# Altium footprint library WR-DSUB_Male.PcbLib: 32 footprints (part 1 of 2)
Each footprint in its own frame and in the unit in brackets; x right, y up, seen from the top. Pads: shape width x height; smd on the part's side, far side on the other; paste and mask are expansions set on the pad; w line width, h text height; cw(c..) or ccw(c..) is an arc to the next point about the centre after c.
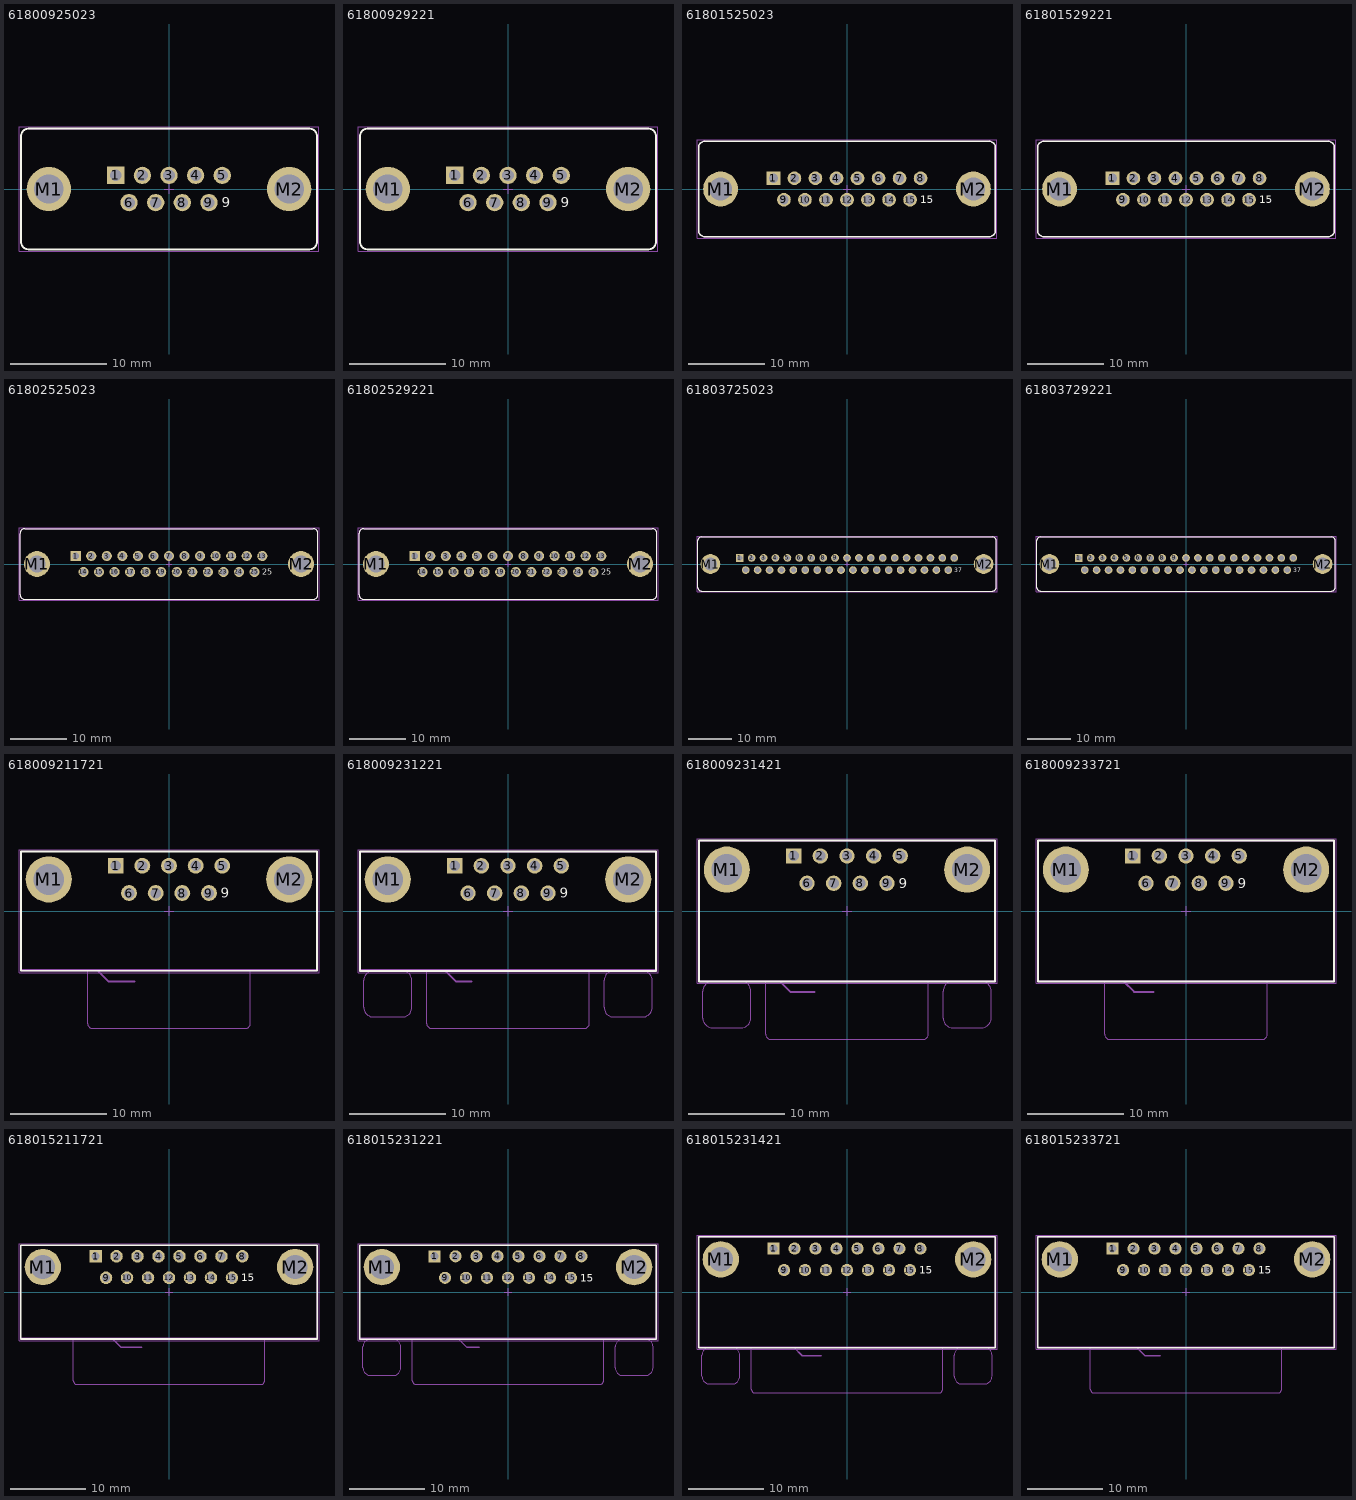
[diagram p0: the footprints below, top view; thin cyan lines are the x and y axes]

## 61800925023 [mm] "9 pins, straight"
height 10.9
pads (11):
  rect 1.8x1.8 hole 1.2: 1(-5.54,1.42)
  round 1.8 hole 1.2: 2(-2.77,1.42) 3(0,1.42) 4(2.77,1.42) 5(5.54,1.42) 6(-4.155,-1.42) 7(-1.385,-1.42) 8(1.385,-1.42) 9(4.155,-1.42)
  round 4.6 hole 3.05: M1(-12.5,0) M2(12.5,0)
Top Overlay:
  lines w0.2: -15.405,-5.475 ccw(c-14.605,-5.475) -14.605,-6.275 14.605,-6.275 ccw(c14.605,-5.475) 15.405,-5.475 15.405,5.475 ccw(c14.605,5.475) 14.605,6.275 -14.605,6.275 ccw(c-14.605,5.475) -15.405,5.475 -15.405,-5.475
  text "9" at 5.5,-1.9 h1.02
Mechanical 13:
  lines w0.1: -15.405,-5.475 ccw(c-14.605,-5.475) -14.605,-6.275 14.605,-6.275 ccw(c14.605,-5.475) 15.405,-5.475 15.405,5.475 ccw(c14.605,5.475) 14.605,6.275 -14.605,6.275 ccw(c-14.605,5.475) -15.405,5.475 -15.405,-5.475
Mechanical 15:
  lines w0.05: -0.5,0 0.5,0 ; 0,-0.5 0,0.5 ; -15.605,-6.475 -15.605,6.475 15.605,6.475 15.605,-6.475 -15.605,-6.475
3D body "61800925023.stp": height 13.22, standoff -3.83, extent -15.4,-6.275 15.4,6.275

## 61800929221 [mm] "Male 09p Straight With board clip & Hex screw UNC 4-40"
height 10.9
pads (11):
  rect 1.8x1.8 hole 1.2: 1(-5.54,1.42)
  round 1.8 hole 1.2: 2(-2.77,1.42) 3(0,1.42) 4(2.77,1.42) 5(5.54,1.42) 6(-4.155,-1.42) 7(-1.385,-1.42) 8(1.385,-1.42) 9(4.155,-1.42)
  round 4.6 hole 3.05: M1(-12.5,0) M2(12.5,0)
Top Overlay:
  lines w0.2: -15.405,-5.475 ccw(c-14.605,-5.475) -14.605,-6.275 14.605,-6.275 ccw(c14.605,-5.475) 15.405,-5.475 15.405,5.475 ccw(c14.605,5.475) 14.605,6.275 -14.605,6.275 ccw(c-14.605,5.475) -15.405,5.475 -15.405,-5.475
  text "9" at 5.5,-1.9 h1.02
Mechanical 13:
  lines w0.1: -15.405,-5.475 ccw(c-14.605,-5.475) -14.605,-6.275 14.605,-6.275 ccw(c14.605,-5.475) 15.405,-5.475 15.405,5.475 ccw(c14.605,5.475) 14.605,6.275 -14.605,6.275 ccw(c-14.605,5.475) -15.405,5.475 -15.405,-5.475
Mechanical 15:
  lines w0.05: -0.5,0 0.5,0 ; 0,-0.5 0,0.5 ; -15.605,-6.475 -15.605,6.475 15.605,6.475 15.605,-6.475 -15.605,-6.475
3D body "61800929221.stp": height 13.22, standoff -3.88, extent -15.4,-6.275 15.4,6.275

## 61801525023 [mm] "15 pins, straight"
height 10.9
pads (17):
  rect 1.8x1.8 hole 1.2: 1(-9.695,1.42)
  round 1.8 hole 1.2: 2(-6.925,1.42) 3(-4.155,1.42) 4(-1.385,1.42) 5(1.385,1.42) 6(4.155,1.42) 7(6.925,1.42) 8(9.695,1.42) 9(-8.31,-1.42) 10(-5.54,-1.42) 11(-2.77,-1.42) 12(0,-1.42) 13(2.77,-1.42) 14(5.54,-1.42) 15(8.31,-1.42)
  round 4.6 hole 3.05: M1(-16.66,0) M2(16.66,0)
Top Overlay:
  lines w0.2: -19.57,-5.475 ccw(c-18.77,-5.475) -18.77,-6.275 18.77,-6.275 ccw(c18.77,-5.475) 19.57,-5.475 19.57,5.475 ccw(c18.77,5.475) 18.77,6.275 -18.77,6.275 ccw(c-18.77,5.475) -19.57,5.475 -19.57,-5.475
  text "15" at 9.655,-1.9 h1.02
Mechanical 13:
  lines w0.1: -19.57,-5.475 ccw(c-18.77,-5.475) -18.77,-6.275 18.77,-6.275 ccw(c18.77,-5.475) 19.57,-5.475 19.57,5.475 ccw(c18.77,5.475) 18.77,6.275 -18.77,6.275 ccw(c-18.77,5.475) -19.57,5.475 -19.57,-5.475
Mechanical 15:
  lines w0.05: -0.5,0 0.5,0 ; 0,-0.5 0,0.5 ; -19.77,-6.475 -19.77,6.475 19.77,6.475 19.77,-6.475 -19.77,-6.475
3D body "61801525023.stp": height 13.22, standoff -3.83, extent -19.6,-6.275 19.6,6.275

## 61801529221 [mm] "Male 15p Straight With board clip & Hex screw UNC 4-40"
height 10.9
pads (17):
  rect 1.8x1.8 hole 1.2: 1(-9.695,1.42)
  round 1.8 hole 1.2: 2(-6.925,1.42) 3(-4.155,1.42) 4(-1.385,1.42) 5(1.385,1.42) 6(4.155,1.42) 7(6.925,1.42) 8(9.695,1.42) 9(-8.31,-1.42) 10(-5.54,-1.42) 11(-2.77,-1.42) 12(0,-1.42) 13(2.77,-1.42) 14(5.54,-1.42) 15(8.31,-1.42)
  round 4.6 hole 3.05: M1(-16.66,0) M2(16.66,0)
Top Overlay:
  lines w0.2: -19.57,-5.475 ccw(c-18.77,-5.475) -18.77,-6.275 18.77,-6.275 ccw(c18.77,-5.475) 19.57,-5.475 19.57,5.475 ccw(c18.77,5.475) 18.77,6.275 -18.77,6.275 ccw(c-18.77,5.475) -19.57,5.475 -19.57,-5.475
  text "15" at 9.655,-1.9 h1.02
Mechanical 13:
  lines w0.1: -19.57,-5.475 ccw(c-18.77,-5.475) -18.77,-6.275 18.77,-6.275 ccw(c18.77,-5.475) 19.57,-5.475 19.57,5.475 ccw(c18.77,5.475) 18.77,6.275 -18.77,6.275 ccw(c-18.77,5.475) -19.57,5.475 -19.57,-5.475
Mechanical 15:
  lines w0.05: -0.5,0 0.5,0 ; 0,-0.5 0,0.5 ; -19.77,-6.475 -19.77,6.475 19.77,6.475 19.77,-6.475 -19.77,-6.475
3D body "61801529221.stp": height 13.22, standoff -3.88, extent -19.6,-6.275 19.6,6.275

## 61802525023 [mm] "25 pins, straight"
height 10.9
pads (27):
  rect 1.8x1.8 hole 1.2: 1(-16.62,1.42)
  round 1.8 hole 1.2: 2(-13.85,1.42) 3(-11.08,1.42) 4(-8.31,1.42) 5(-5.54,1.42) 6(-2.77,1.42) 7(0,1.42) 8(2.77,1.42) 9(5.54,1.42) 10(8.31,1.42) 11(11.08,1.42) 12(13.85,1.42) 13(16.62,1.42) 14(-15.235,-1.42) 15(-12.465,-1.42) 16(-9.695,-1.42) 17(-6.925,-1.42) 18(-4.155,-1.42) 19(-1.385,-1.42) 20(1.385,-1.42) 21(4.155,-1.42) 22(6.925,-1.42) 23(9.695,-1.42) 24(12.465,-1.42) 25(15.235,-1.42)
  round 4.6 hole 3.05: M1(-23.52,0) M2(23.52,0)
Top Overlay:
  lines w0.2: -26.52,5.425 -26.52,-5.475 ccw(c-25.72,-5.475) -25.72,-6.275 25.72,-6.275 ccw(c25.72,-5.475) 26.52,-5.475 26.52,5.425 ; -26.52,5.475 cw(c-25.72,5.475) -25.72,6.275 25.72,6.275 cw(c25.72,5.475) 26.52,5.475
  text "25" at 16.58,-1.9 h1.02
Mechanical 13:
  lines w0.1: -26.52,5.425 -26.52,-5.475 ccw(c-25.72,-5.475) -25.72,-6.275 25.72,-6.275 ccw(c25.72,-5.475) 26.52,-5.475 26.52,5.425 ; -26.52,5.475 cw(c-25.72,5.475) -25.72,6.275 25.72,6.275 cw(c25.72,5.475) 26.52,5.475
Mechanical 15:
  lines w0.05: -0.5,0 0.5,0 ; 0,-0.5 0,0.5 ; -26.72,-6.475 26.72,-6.475 26.72,6.475 -26.72,6.475 -26.72,-6.475
3D body "61802525023.stp": height 13.22, standoff -3.83, extent -26.525,-6.275 26.525,6.275

## 61802529221 [mm] "Male 25p Straight With board clip & Hex screw UNC 4-40"
height 10.9
pads (27):
  rect 1.8x1.8 hole 1.2: 1(-16.62,1.42)
  round 1.8 hole 1.2: 2(-13.85,1.42) 3(-11.08,1.42) 4(-8.31,1.42) 5(-5.54,1.42) 6(-2.77,1.42) 7(0,1.42) 8(2.77,1.42) 9(5.54,1.42) 10(8.31,1.42) 11(11.08,1.42) 12(13.85,1.42) 13(16.62,1.42) 14(-15.235,-1.42) 15(-12.465,-1.42) 16(-9.695,-1.42) 17(-6.925,-1.42) 18(-4.155,-1.42) 19(-1.385,-1.42) 20(1.385,-1.42) 21(4.155,-1.42) 22(6.925,-1.42) 23(9.695,-1.42) 24(12.465,-1.42) 25(15.235,-1.42)
  round 4.6 hole 3.05: M1(-23.52,0) M2(23.52,0)
Top Overlay:
  lines w0.2: -26.52,-5.475 ccw(c-25.72,-5.475) -25.72,-6.275 25.72,-6.275 ccw(c25.72,-5.475) 26.52,-5.475 26.52,5.475 ccw(c25.72,5.475) 25.72,6.275 -25.72,6.275 ccw(c-25.72,5.475) -26.52,5.475 -26.52,-5.475
  text "25" at 16.58,-1.9 h1.02
Mechanical 13:
  lines w0.1: -26.52,-5.475 ccw(c-25.72,-5.475) -25.72,-6.275 25.72,-6.275 ccw(c25.72,-5.475) 26.52,-5.475 26.52,5.475 ccw(c25.72,5.475) 25.72,6.275 -25.72,6.275 ccw(c-25.72,5.475) -26.52,5.475 -26.52,-5.475
Mechanical 15:
  lines w0.05: -0.5,0 0.5,0 ; 0,-0.5 0,0.5 ; -26.72,-6.475 26.72,-6.475 26.72,6.475 -26.72,6.475 -26.72,-6.475
3D body "61802529221.stp": height 13.22, standoff -3.88, extent -26.525,-6.275 26.525,6.275

## 61803725023 [mm] "37 pins, straight"
height 10.9
pads (39):
  rect 1.8x1.8 hole 1.2: 1(-24.93,1.42)
  round 1.8 hole 1.2: 2(-22.16,1.42) 3(-19.39,1.42) 4(-16.62,1.42) 5(-13.85,1.42) 6(-11.08,1.42) 7(-8.31,1.42) 8(-5.54,1.42) 9(-2.77,1.42) 10(0,1.42) 11(2.77,1.42) 12(5.54,1.42) 13(8.31,1.42) 14(11.08,1.42) 15(13.85,1.42) 16(16.62,1.42) 17(19.39,1.42) 18(22.16,1.42) 19(24.93,1.42) 20(-23.545,-1.42) 21(-20.775,-1.42) 22(-18.005,-1.42) 23(-15.235,-1.42) 24(-12.465,-1.42) 25(-9.695,-1.42) 26(-6.925,-1.42) 27(-4.155,-1.42) 28(-1.385,-1.42) 29(1.385,-1.42) 30(4.155,-1.42) 31(6.925,-1.42) 32(9.695,-1.42) 33(12.465,-1.42) 34(15.235,-1.42) 35(18.005,-1.42) 36(20.775,-1.42) 37(23.545,-1.42)
  round 4.6 hole 3.05: M1(-31.75,0) M2(31.75,0)
Top Overlay:
  lines w0.2: -34.66,-5.475 ccw(c-33.86,-5.475) -33.86,-6.275 33.86,-6.275 ccw(c33.86,-5.475) 34.66,-5.475 34.66,5.475 ccw(c33.86,5.475) 33.86,6.275 -33.86,6.275 ccw(c-33.86,5.475) -34.66,5.475 -34.66,-5.475
  text "37" at 24.89,-1.9 h1.02
Mechanical 13:
  lines w0.1: -34.66,-5.475 ccw(c-33.86,-5.475) -33.86,-6.275 33.86,-6.275 ccw(c33.86,-5.475) 34.66,-5.475 34.66,5.475 ccw(c33.86,5.475) 33.86,6.275 -33.86,6.275 ccw(c-33.86,5.475) -34.66,5.475 -34.66,-5.475
Mechanical 15:
  lines w0.05: -0.5,0 0.5,0 ; 0,-0.5 0,0.5 ; -34.86,-6.475 34.86,-6.475 34.86,6.475 -34.86,6.475 -34.86,-6.475
3D body "61803725023.stp": height 13.22, standoff -3.83, extent -34.7,-6.275 34.7,6.275

## 61803729221 [mm] "Male 37p Straight With board clip & Hex screw UNC 4-40"
height 10.9
pads (39):
  rect 1.8x1.8 hole 1.2: 1(-24.93,1.42)
  round 1.8 hole 1.2: 2(-22.16,1.42) 3(-19.39,1.42) 4(-16.62,1.42) 5(-13.85,1.42) 6(-11.08,1.42) 7(-8.31,1.42) 8(-5.54,1.42) 9(-2.77,1.42) 10(0,1.42) 11(2.77,1.42) 12(5.54,1.42) 13(8.31,1.42) 14(11.08,1.42) 15(13.85,1.42) 16(16.62,1.42) 17(19.39,1.42) 18(22.16,1.42) 19(24.93,1.42) 20(-23.545,-1.42) 21(-20.775,-1.42) 22(-18.005,-1.42) 23(-15.235,-1.42) 24(-12.465,-1.42) 25(-9.695,-1.42) 26(-6.925,-1.42) 27(-4.155,-1.42) 28(-1.385,-1.42) 29(1.385,-1.42) 30(4.155,-1.42) 31(6.925,-1.42) 32(9.695,-1.42) 33(12.465,-1.42) 34(15.235,-1.42) 35(18.005,-1.42) 36(20.775,-1.42) 37(23.545,-1.42)
  round 4.6 hole 3.05: M1(-31.75,0) M2(31.75,0)
Top Overlay:
  lines w0.2: -34.66,-5.475 ccw(c-33.86,-5.475) -33.86,-6.275 33.86,-6.275 ccw(c33.86,-5.475) 34.66,-5.475 34.66,5.475 ccw(c33.86,5.475) 33.86,6.275 -33.86,6.275 ccw(c-33.86,5.475) -34.66,5.475 -34.66,-5.475
  text "37" at 24.89,-1.9 h1.02
Mechanical 13:
  lines w0.1: -34.66,-5.475 ccw(c-33.86,-5.475) -33.86,-6.275 33.86,-6.275 ccw(c33.86,-5.475) 34.66,-5.475 34.66,5.475 ccw(c33.86,5.475) 33.86,6.275 -33.86,6.275 ccw(c-33.86,5.475) -34.66,5.475 -34.66,-5.475
Mechanical 15:
  lines w0.05: -0.5,0 0.5,0 ; 0,-0.5 0,0.5 ; -34.86,-6.475 -34.86,6.475 34.86,6.475 34.86,-6.475 -34.86,-6.475
3D body "61803729221.stp": height 13.22, standoff -3.88, extent -34.7,-6.275 34.7,6.275

## 618009211721 [mm] "9 pins, right angled, 8.08mm, board lock & UNC4-40 rivet without hex screw"
height 12.5
pads (11):
  rect 1.65x1.65 hole 1.09: 1(-5.54,4.72)
  round 1.65 hole 1.09: 2(-2.77,4.72) 3(0,4.72) 4(2.77,4.72) 5(5.54,4.72) 6(-4.155,1.88) 7(-1.385,1.88) 8(1.385,1.88) 9(4.155,1.88)
  round 4.8 hole 3.2: M1(-12.5,3.3) M2(12.5,3.3)
Top Overlay:
  lines w0.2: -15.4,-6.2 -15.4,6.2 15.4,6.2 15.4,-6.2 -15.4,-6.2
  text "9" at 5.4,1.4 h1.02
Mechanical 2:
  lines w0.2: -15.4,-6.12 15.4,-6.12 ; -7.5,-6.12 -6.32,-7.3 -3.6,-7.3
  text "PCB Edge" at -3.1,-7.8 h1.02
Mechanical 13:
  lines w0.1: -8.46,-6.2 -8.46,-11.7 ccw(c-7.96,-11.7) -7.96,-12.2 7.96,-12.2 ; 8.46,-6.2 8.46,-11.7 cw(c7.96,-11.7) 7.96,-12.2 ; 7.96,-12.2 7.96,-12.2 ; -15.4,-6.2 15.4,-6.2 15.4,6.2 -15.4,6.2 -15.4,-6.2
Mechanical 15:
  lines w0.05: -0.5,0 0.5,0 ; 0,-0.5 0,0.5 ; -15.6,-6.4 -15.6,6.4 15.6,6.4 15.6,-6.4 -15.6,-6.4
3D body "618009211721.stp": height 12.55, standoff -3.95, extent -15.4,-12.2 15.4,6.2

## 618009231221 [mm] "9 pins, right angled, 8.08mm, with hex screw"
height 12.5
pads (11):
  rect 1.6x1.6 hole 1.09: 1(-5.54,4.72)
  round 1.6 hole 1.09: 2(-2.77,4.72) 3(0,4.72) 4(2.77,4.72) 5(5.54,4.72) 6(-4.155,1.88) 7(-1.385,1.88) 8(1.385,1.88) 9(4.155,1.88)
  round 4.8 hole 3.2: M1(-12.5,3.3) M2(12.5,3.3)
Top Overlay:
  lines w0.2: -15.4,-6.2 15.4,-6.2 15.4,6.2 -15.4,6.2 -15.4,-6.2
  text "9" at 5.4,1.4 h1.02
Mechanical 2:
  lines w0.2: -15.4,-6.12 15.4,-6.12 ; -6.6,-6.12 -5.42,-7.3 -3.8,-7.3
  text "PCB Edge" at -3.4,-7.82 h1.02
Mechanical 13:
  lines w0.1: -14,-6.2 ccw(c-14,-7.2) -15,-7.2 -15,-10 ccw(c-14,-10) -14,-11 -11,-11 ccw(c-11,-10) -10,-10 -10,-7.2 ccw(c-11,-7.2) -11,-6.2 ; -8.46,-6.2 -8.46,-11.68 ccw(c-7.96,-11.68) -7.96,-12.18 7.94,-12.18 ; 7.96,-12.18 ccw(c7.96,-11.68) 8.46,-11.68 8.46,-6.2 ; 11,-6.2 ccw(c11,-7.2) 10,-7.2 10,-10 ccw(c11,-10) 11,-11 14,-11 ccw(c14,-10) 15,-10 15,-7.2 ccw(c14,-7.2) 14,-6.2 ; -15.4,-6.2 -15.4,6.2 15.4,6.2 15.4,-6.2 -15.4,-6.2 ; 7.95,-12.18 7.95,-12.18
Mechanical 15:
  lines w0.05: -0.5,0 0.5,0 ; 0,-0.5 0,0.5 ; -15.6,-6.4 -15.6,6.4 15.6,6.4 15.6,-6.4 -15.6,-6.4
3D body "618009231221.stp": height 12.55, standoff -3.95, extent -15.4,-12.2 15.4,6.2

## 618009231421 [mm] "9 pins, right angled, 10.3mm, with hex screw"
height 12.5
pads (11):
  rect 1.6x1.6 hole 1.09: 1(-5.54,5.735)
  round 1.6 hole 1.09: 2(-2.77,5.735) 3(0,5.735) 4(2.77,5.735) 5(5.54,5.735) 6(-4.155,2.895) 7(-1.385,2.895) 8(1.385,2.895) 9(4.155,2.895)
  round 4.8 hole 3.2: M1(-12.495,4.315) M2(12.495,4.315)
Top Overlay:
  lines w0.2: -15.4,-7.325 15.4,-7.325 15.4,7.325 -15.4,7.325 -15.4,-7.325
  text "9" at 5.4,2.4 h1.02
Mechanical 2:
  lines w0.2: -15.4,-7.305 15.4,-7.305 ; -7,-7.305 -5.905,-8.4 -3.4,-8.4
  text "PCB Edge" at -3.1,-8.9 h1.02
Mechanical 13:
  lines w0.1: -14,-7.325 ccw(c-14,-8.325) -15,-8.325 -15,-11.125 ccw(c-14,-11.125) -14,-12.125 -11,-12.125 ccw(c-11,-11.125) -10,-11.125 -10,-8.325 ccw(c-11,-8.325) -11,-7.325 ; -8.45,-7.325 -8.45,-12.825 ccw(c-7.95,-12.825) -7.95,-13.325 7.95,-13.325 ; 8.45,-7.325 8.45,-12.825 cw(c7.95,-12.825) 7.95,-13.325 ; 11,-7.325 ccw(c11,-8.325) 10,-8.325 10,-11.125 ccw(c11,-11.125) 11,-12.125 14,-12.125 ccw(c14,-11.125) 15,-11.125 15,-8.325 ccw(c14,-8.325) 14,-7.325 ; 7.95,-13.325 7.95,-13.325 ; -15.4,-7.325 -15.4,7.325 15.4,7.325 15.4,-7.325 -15.4,-7.325
Mechanical 15:
  lines w0.05: -0.5,0 0.5,0 ; 0,-0.5 0,0.5 ; -15.6,-7.525 -15.6,7.525 15.6,7.525 15.6,-7.525 -15.6,-7.525
3D body "618009231421.stp": height 12.62, standoff -3.72, extent -15.405,-13.325 15.405,7.325

## 618009233721 [mm] "9 pins, right angled, 10.3mm, board lock & UNC4-40 rivet without hex screw"
height 12.5
pads (11):
  rect 1.6x1.6 hole 1.09: 1(-5.54,5.735)
  round 1.6 hole 1.09: 2(-2.77,5.735) 3(0,5.735) 4(2.77,5.735) 5(5.54,5.735) 6(-4.155,2.895) 7(-1.385,2.895) 8(1.385,2.895) 9(4.155,2.895)
  round 4.8 hole 3.2: M1(-12.495,4.315) M2(12.495,4.315)
Top Overlay:
  lines w0.2: -15.4,-7.325 -15.4,7.325 15.4,7.325 15.4,-7.325 -15.4,-7.325
  text "9" at 5.4,2.4 h1.02
Mechanical 2:
  lines w0.2: -15.4,-7.305 15.4,-7.305 ; -6.5,-7.305 -5.405,-8.4 -3.4,-8.4
  text "PCB Edge" at -3.1,-9 h1.02
Mechanical 13:
  lines w0.1: -8.46,-7.325 -8.46,-12.825 ccw(c-7.96,-12.825) -7.96,-13.325 7.96,-13.325 ccw(c7.96,-12.825) 8.46,-12.825 8.46,-7.325 ; -15.4,-7.325 15.4,-7.325 15.4,7.325 -15.4,7.325 -15.4,-7.325
Mechanical 15:
  lines w0.05: -0.5,0 0.5,0 ; 0,-0.5 0,0.5 ; -15.6,-7.525 -15.6,7.525 15.6,7.525 15.6,-7.525 -15.6,-7.525
3D body "618009233721.stp": height 12.57, standoff -3.77, extent -15.408,-13.325 15.408,7.325

## 618015211721 [mm] "15 pins, right angled, 8.08mm, board lock & UNC4-40 rivet without hex screw"
height 12.5
pads (17):
  rect 1.65x1.65 hole 1.09: 1(-9.695,4.72)
  round 1.65 hole 1.09: 2(-6.925,4.72) 3(-4.155,4.72) 4(-1.385,4.72) 5(1.385,4.72) 6(4.155,4.72) 7(6.925,4.72) 8(9.695,4.72) 9(-8.31,1.88) 10(-5.54,1.88) 11(-2.77,1.88) 12(0,1.88) 13(2.77,1.88) 14(5.54,1.88) 15(8.31,1.88)
  round 4.8 hole 3.2: M1(-16.65,3.3) M2(16.65,3.3)
Top Overlay:
  lines w0.2: -19.6,-6.2 19.6,-6.2 19.6,6.2 -19.6,6.2 -19.6,-6.2
  text "15" at 9.555,1.4 h1.02
Mechanical 2:
  lines w0.2: -19.6,-6.12 19.6,-6.12 ; -7.5,-6.12 -6.32,-7.3 -3.6,-7.3
  text "PCB Edge" at -3.1,-7.8 h1.02
Mechanical 13:
  lines w0.1: -12.625,-6.2 -12.625,-11.7 ccw(c-12.125,-11.7) -12.125,-12.2 12.125,-12.2 ccw(c12.125,-11.7) 12.625,-11.7 12.625,-6.2 ; -19.6,-6.2 -19.6,6.2 19.6,6.2 19.6,-6.2 -19.6,-6.2
Mechanical 15:
  lines w0.05: -0.5,0 0.5,0 ; 0,-0.5 0,0.5 ; -19.8,-6.4 19.8,-6.4 19.8,6.4 -19.8,6.4 -19.8,-6.4
3D body "618015211721.stp": height 12.55, standoff -3.95, extent -19.6,-12.2 19.6,6.2

## 618015231221 [mm] "15 pins, right angled, 8.08mm, with hex screw"
height 12.5
pads (17):
  rect 1.6x1.6 hole 1.09: 1(-9.695,4.72)
  round 1.6 hole 1.09: 2(-6.925,4.72) 3(-4.155,4.72) 4(-1.385,4.72) 5(1.385,4.72) 6(4.155,4.72) 7(6.925,4.72) 8(9.695,4.72) 9(-8.31,1.88) 10(-5.54,1.88) 11(-2.77,1.88) 12(0,1.88) 13(2.77,1.88) 14(5.54,1.88) 15(8.31,1.88)
  round 4.8 hole 3.2: M1(-16.65,3.3) M2(16.65,3.3)
Top Overlay:
  lines w0.2: -19.6,-6.2 -19.6,6.2 19.6,6.2 19.6,-6.2 -19.6,-6.2
  text "15" at 9.555,1.4 h1.02
Mechanical 2:
  lines w0.2: -19.6,-6.12 19.6,-6.12 ; -6.6,-6.12 -5.42,-7.3 -3.8,-7.3
  text "PCB Edge" at -3.4,-7.82 h1.02
Mechanical 13:
  lines w0.1: -18.15,-6.2 ccw(c-18.15,-7.2) -19.15,-7.2 -19.15,-10 ccw(c-18.15,-10) -18.15,-11 -15.15,-11 ccw(c-15.15,-10) -14.15,-10 -14.15,-7.2 ccw(c-15.15,-7.2) -15.15,-6.2 ; -12.625,-6.2 -12.625,-11.68 ccw(c-12.125,-11.68) -12.125,-12.18 12.125,-12.18 ccw(c12.125,-11.68) 12.625,-11.68 12.625,-6.2 ; 15.15,-6.2 ccw(c15.15,-7.2) 14.15,-7.2 14.15,-10 ccw(c15.15,-10) 15.15,-11 18.15,-11 ccw(c18.15,-10) 19.15,-10 19.15,-7.2 ccw(c18.15,-7.2) 18.15,-6.2 ; -19.6,-6.2 19.6,-6.2 19.6,6.2 -19.6,6.2 -19.6,-6.2
Mechanical 15:
  lines w0.05: -0.5,0 0.5,0 ; 0,-0.5 0,0.5 ; -19.8,-6.4 19.8,-6.4 19.8,6.4 -19.8,6.4 -19.8,-6.4
3D body "618015231221.stp": height 12.55, standoff -3.95, extent -19.6,-12.2 19.6,6.2

## 618015231421 [mm] "15 pins, right angled, 10.3mm, with hex screw"
height 12.5
pads (17):
  rect 1.6x1.6 hole 1.09: 1(-9.695,5.735)
  round 1.6 hole 1.09: 2(-6.925,5.735) 3(-4.155,5.735) 4(-1.385,5.735) 5(1.385,5.735) 6(4.155,5.735) 7(6.925,5.735) 8(9.695,5.735) 9(-8.31,2.895) 10(-5.54,2.895) 11(-2.77,2.895) 12(0,2.895) 13(2.77,2.895) 14(5.54,2.895) 15(8.31,2.895)
  round 4.8 hole 3.2: M1(-16.66,4.315) M2(16.66,4.315)
Top Overlay:
  lines w0.2: -19.6,-7.325 -19.6,7.325 19.6,7.325 19.6,-7.325 -19.6,-7.325
  text "15" at 9.555,2.4 h1.02
Mechanical 2:
  lines w0.2: -19.6,-7.305 19.6,-7.305 ; -7,-7.305 -5.905,-8.4 -3.4,-8.4
  text "PCB Edge" at -3.1,-8.9 h1.02
Mechanical 13:
  lines w0.1: -18.15,-7.325 ccw(c-18.15,-8.325) -19.15,-8.325 -19.15,-11.125 ccw(c-18.15,-11.125) -18.15,-12.125 -15.15,-12.125 ccw(c-15.15,-11.125) -14.15,-11.125 -14.15,-8.325 ccw(c-15.15,-8.325) -15.15,-7.325 ; -12.625,-7.325 -12.625,-12.825 ccw(c-12.125,-12.825) -12.125,-13.325 12.125,-13.325 ccw(c12.125,-12.825) 12.625,-12.825 12.625,-7.325 ; 15.15,-7.325 ccw(c15.15,-8.325) 14.15,-8.325 14.15,-11.125 ccw(c15.15,-11.125) 15.15,-12.125 18.15,-12.125 ccw(c18.15,-11.125) 19.15,-11.125 19.15,-8.325 ccw(c18.15,-8.325) 18.15,-7.325 ; -19.6,-7.325 19.6,-7.325 19.6,7.325 -19.6,7.325 -19.6,-7.325
Mechanical 15:
  lines w0.05: -0.5,0 0.5,0 ; 0,-0.5 0,0.5 ; -19.8,-7.525 19.8,-7.525 19.8,7.525 -19.8,7.525 -19.8,-7.525
3D body "618015231421.stp": height 12.62, standoff -3.72, extent -19.57,-13.325 19.57,7.325

## 618015233721 [mm] "15 pins, right angled, 10.3mm, board lock & UNC4-40 rivet without hex screw"
height 12.5
pads (17):
  rect 1.6x1.6 hole 1.09: 1(-9.695,5.735)
  round 1.6 hole 1.09: 2(-6.925,5.735) 3(-4.155,5.735) 4(-1.385,5.735) 5(1.385,5.735) 6(4.155,5.735) 7(6.925,5.735) 8(9.695,5.735) 9(-8.31,2.895) 10(-5.54,2.895) 11(-2.77,2.895) 12(0,2.895) 13(2.77,2.895) 14(5.54,2.895) 15(8.31,2.895)
  round 4.8 hole 3.2: M1(-16.66,4.315) M2(16.66,4.315)
Top Overlay:
  lines w0.2: -19.6,-7.325 19.6,-7.325 19.6,7.325 -19.6,7.325 -19.6,-7.325
  text "15" at 9.555,2.4 h1.02
Mechanical 2:
  lines w0.2: -19.6,-7.305 19.6,-7.305 ; -6.5,-7.305 -5.405,-8.4 -3.4,-8.4
  text "PCB Edge" at -3.1,-9 h1.02
Mechanical 13:
  lines w0.1: -12.625,-7.325 -12.625,-12.825 ccw(c-12.125,-12.825) -12.125,-13.325 12.125,-13.325 ccw(c12.125,-12.825) 12.625,-12.825 12.625,-7.325 ; -19.6,-7.325 -19.6,7.325 19.6,7.325 19.6,-7.325 -19.6,-7.325
Mechanical 15:
  lines w0.05: -0.5,0 0.5,0 ; 0,-0.5 0,0.5 ; -19.8,-7.525 19.8,-7.525 19.8,7.525 -19.8,7.525 -19.8,-7.525
3D body "618015233721.stp": height 12.57, standoff -3.77, extent -19.573,-13.325 19.573,7.325